# Altium footprint library CustomCase.PcbLib: 293 footprints (part 19 of 19)
Each footprint in its own frame and in the unit in brackets; x right, y up, seen from the top. Pads: shape width x height; smd on the part's side, far side on the other; paste and mask are expansions set on the pad; w line width, h text height; cw(c..) or ccw(c..) is an arc to the next point about the centre after c.
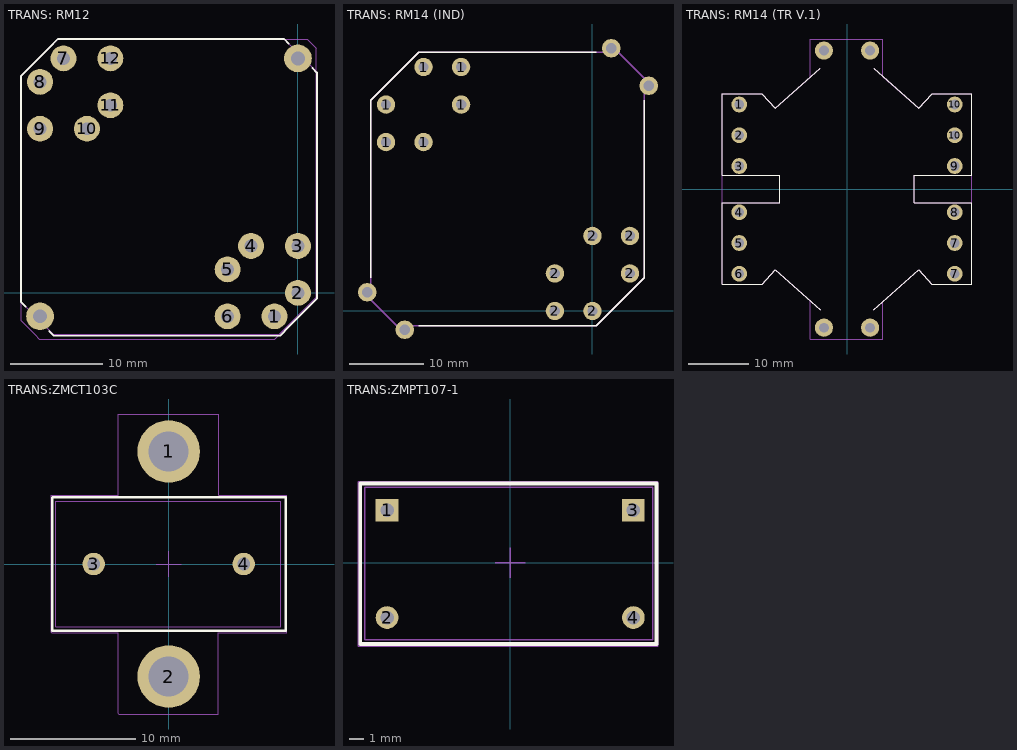
[diagram p18: the footprints below, top view; thin cyan lines are the x and y axes]

## TRANS: RM12 [mm]
pads (14):
  round 2.8 hole 1.4: 1(-2.54,-2.54) 2(0,0) 3(0,5.08) 4(-5.08,5.08) 5(-7.62,2.54) 6(-7.62,-2.54) 7(-25.4,25.4) 8(-27.94,22.86) 9(-27.94,17.78) 10(-22.86,17.78) 11(-20.32,20.32) 12(-20.32,25.4)
  round 3 hole 1.5: ""(-27.94,-2.54) ""(0,25.4)
Top Overlay:
  lines w0.2: -29.5,-1.5 -30,-1 ; -26.94,-4.14 -26.44,-4.64 -1.94,-4.64 -0.94,-3.64 2.06,-0.64 2.06,23.86 ; -1,27 -1.5,27.5 -26,27.5 -27,26.5 -30,23.5 -30,-1 ; 1.56,24.36 2.06,23.86 ; -30,-1 -30,-1 ; 2.06,23.86 2.06,23.86
Top Assy:
  lines w0.1: -30,-1 -30,23.5 -26,27.5 -1.5,27.5 2,24 2,-0.5 -2,-4.5 -26.5,-4.5 -30,-1
Size Area:
  lines w0.1: -30,-3 -28.5,-4.5 -28,-5 -2.5,-5 2,-0.5 2,6 2,26.5 1.5,27 1,27.5 -26,27.5 -27.5,26 -30,23.5 -30,20.5 -30,-3
3D body "User Library-RM12-1.STEP": height 24.65, standoff -3.95, extent -41.68,-16.28 13.681,39.081

## TRANS: RM14 (IND) [mm]
pads (16):
  round 2.5 hole 1.4: 1(-27.94,22.86) 1(-27.94,27.94) 1(-22.86,22.86) 1(-22.86,33.02) 1(-17.78,27.94) 1(-17.78,33.02) 2(-5.08,0) 2(-5.08,5.08) 2(0,0) 2(0,10.16) 2(5.08,5.08) 2(5.08,10.16) ""(-30.48,2.54) ""(-25.4,-2.54) ""(2.54,35.56) ""(7.62,30.48)
Top Overlay:
  lines w0.2: -30,4.5 -30,28.5 -23.5,35 0.5,35 ; -23.5,-2 0.5,-2 7,4.5 7,28.5
Top Assy:
  lines w0.2: -30,1.5 -30,28.5 -23.5,35 -21,35 3.5,35 7,31.5 7,4.5 0.5,-2 -26.5,-2 -30,1.5
Size Area:
  lines w0.1: -30,1.5 -26.5,-2 0.5,-2 7,4.5 7,31.5 3.5,35 -23.5,35 -30,28.5 -30,1.5
3D body "STEP-WE-PFC-RM14-rev1.stp": height 30.1, standoff -4, extent -43.036,-15.036 20.036,48.036

## TRANS: RM14 (TR V.1) [mm]
pads (16):
  round 2.6 hole 1.6: 1(-17.78,13.97) 2(-17.78,8.89) 3(-17.78,3.81) 4(-17.78,-3.81) 5(-17.78,-8.89) 6(-17.78,-13.97) 7(17.78,-13.97) 7(17.78,-8.89) 8(17.78,-3.81) 9(17.78,3.81) 10(17.78,8.89) 10(17.78,13.97)
  round 3 hole 1.6: ""(-3.81,-22.86) ""(-3.81,22.86) ""(3.81,-22.86) ""(3.81,22.86)
Top Overlay:
  lines w0.2: -4.38,-19.93 -11.88,-13.33 -13.992,-15.73 -20.58,-15.73 -20.58,-2.23 -11.08,-2.23 -11.08,2.27 -20.58,2.27 -20.58,15.77 -14.027,15.77 -11.88,13.33 -4.38,19.93 ; 4.38,-19.93 11.88,-13.33 13.987,-15.724 20.58,-15.724 ; 4.38,19.93 11.88,13.33 14.027,15.77 20.58,15.77 20.58,2.27 11.08,2.27 11.08,-2.23 20.58,-2.23 20.58,-15.73
Top Assy:
  lines w0.1: -4.38,-19.93 -11.88,-13.33 -13.992,-15.73 -20.58,-15.73 -20.58,-2.23 -11.08,-2.23 -11.08,2.27 -20.58,2.27 -20.58,15.77 -14.027,15.77 -11.88,13.33 -4.38,19.93 ; 4.38,-19.93 11.88,-13.33 13.987,-15.724 20.58,-15.724 ; 4.38,19.93 11.88,13.33 14.027,15.77 20.58,15.77 20.58,2.27 11.08,2.27 11.08,-2.23 20.58,-2.23 20.58,-15.73
Size Area:
  lines w0.1: -20.58,-15.73 -20.58,15.77 -14.027,15.77 -11.88,13.33 -6.08,18.434 -6.08,24.77 5.92,24.77 5.92,18.57 11.88,13.33 14.027,15.77 20.58,15.77 20.58,2.27 20.58,-2.23 20.58,-15.724 13.987,-15.724 11.88,-13.33 5.92,-18.575 5.92,-24.73 -6.08,-24.73 -6.08,-18.43 -11.88,-13.33 -13.992,-15.73 -20.58,-15.73
3D body "6666.STEP": height 30.72, standoff -4.3, extent -20.5,-23.556 20.5,23.556

## TRANS:ZMCT103C [mm] "Curient trnsformer"
pads (4):
  round 5 hole 3.2: 1(0,9) 2(0,-9)
  round 1.8 hole 1: 3(-6,0) 4(6,0)
Top Overlay:
  lines w0.2: -9.3,-5.35 9.35,-5.35 9.35,5.35 -9.25,5.35 -9.3,5.3 -9.3,5 -9.3,-5.35
Top Assy:
  lines w0.1: -9.025,-5 -9.025,5 8.975,5 8.975,-5 -9.025,-5
Size Area:
  lines w0.1: -1,0 1,0 ; 0,-1 0,1 ; -9.4,-5.45 -9.35,-5.5 -4.05,-5.5 -4.05,-11.95 -4,-12 3.95,-12 3.95,-5.5 9.45,-5.5 9.45,5.5 4,5.5 4,12 -4.05,12 -4.05,5.5 -9.4,5.5 -9.4,-5.45
3D body "zmct103c.stp": height 19, standoff -3.9, extent -9.025,-5 8.975,5

## TRANS:ZMPT107-1 [mil]
pads (4):
  rect 60x60 hole 35.98: 1(-324.8,138.58) 3(324.8,138.58)
  round 60 hole 35.98: 2(-324.8,-144.88) 4(324.81,-144.88)
Top Overlay:
  lines w10: -395.67,-214.57 -395.67,208.66 385.83,208.66 385.83,-214.57 -395.67,-214.57
Top Assy:
  lines w3.94: -383.86,-203.15 -383.86,198.43 375.99,198.43 375.99,-203.15 -383.86,-203.15
Size Area:
  lines w3.94: -39.37,0 39.37,0 ; 0,-39.37 0,39.37 ; -401.57,-220.47 389.76,-220.47 389.76,213.58 -401.57,213.58 -401.57,-220.47
3D body "User Library-ZMPT107.STEP": height 716.54, standoff -206.69, extent -383.86,-203.15 375.99,198.43